# Altium footprint library LUMI_Handy_Soldering_LIB.PcbLib: 562 footprints (part 31 of 36)
Each footprint in its own frame and in the unit in brackets; x right, y up, seen from the top. Pads: shape width x height; smd on the part's side, far side on the other; paste and mask are expansions set on the pad; w line width, h text height; cw(c..) or ccw(c..) is an arc to the next point about the centre after c.
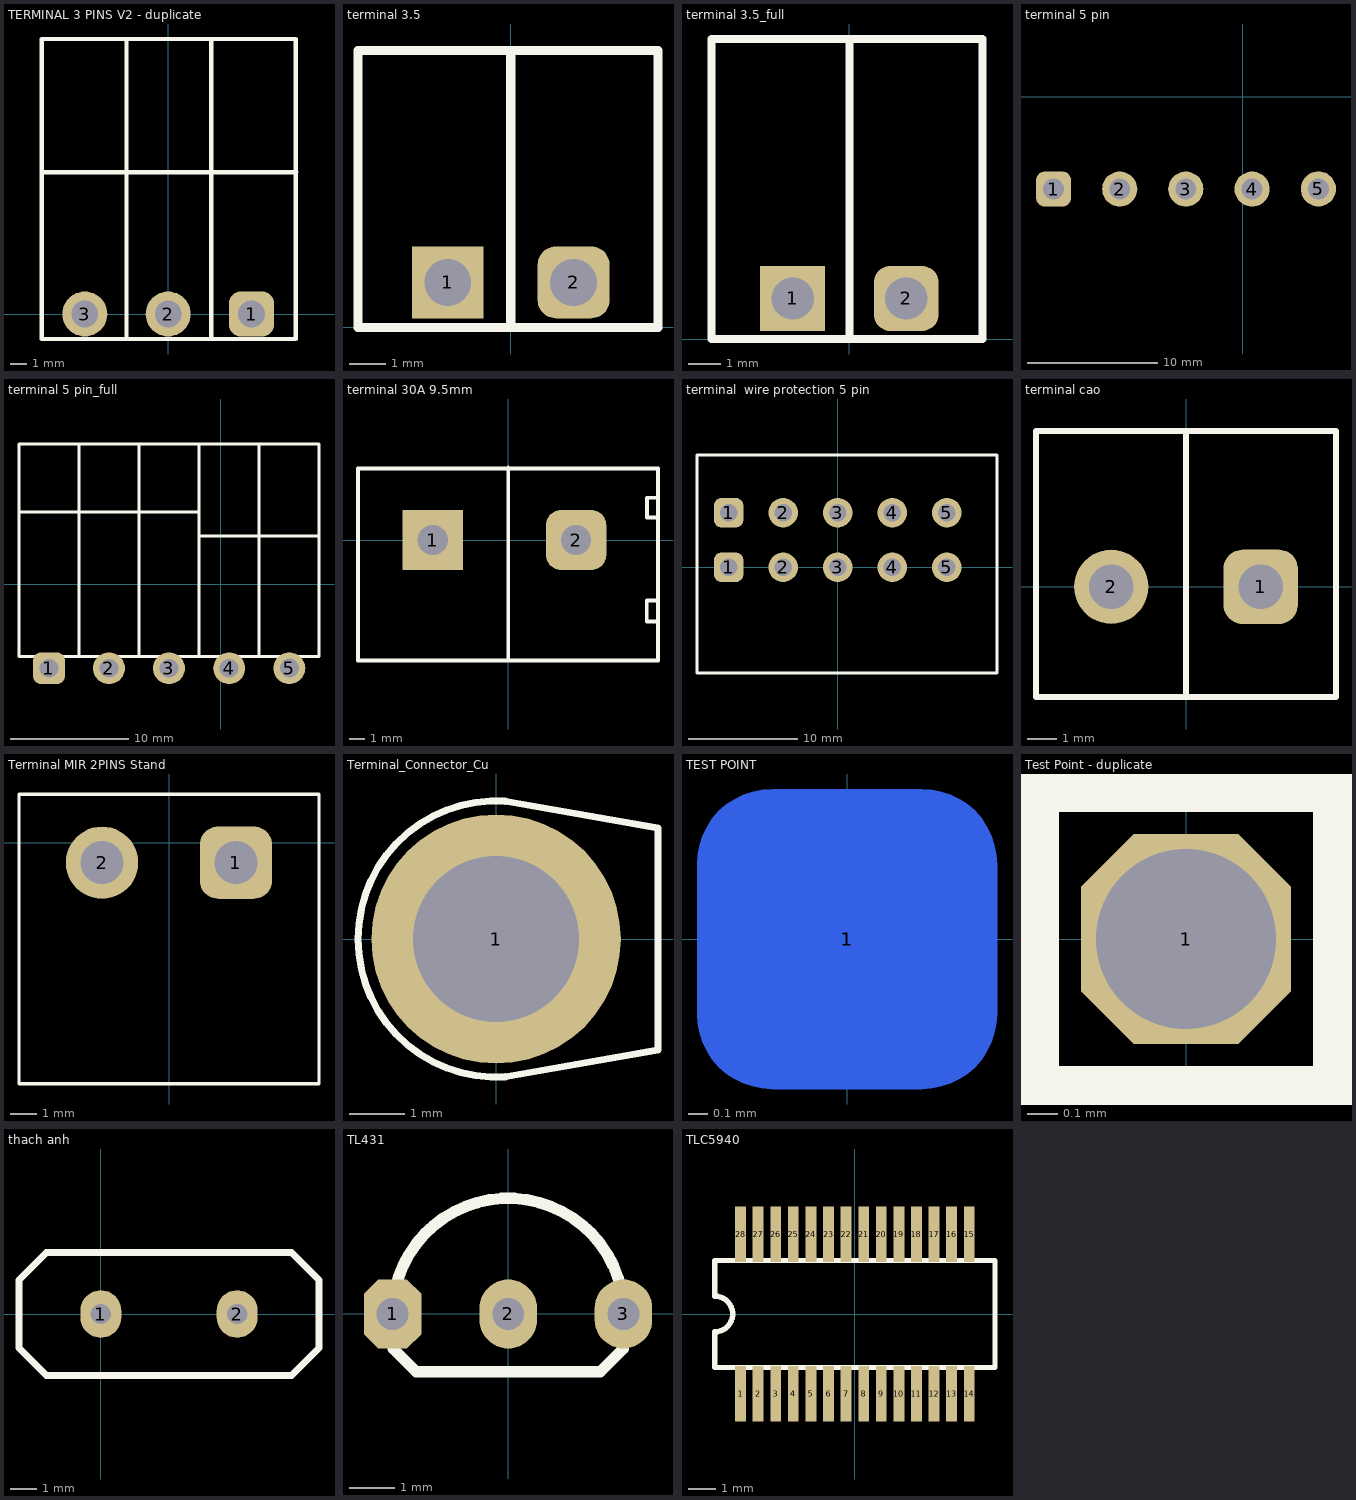
[diagram p30: the footprints below, top view; thin cyan lines are the x and y axes]

## TERMINAL 3 PINS V2 - duplicate [mm]
pads (3):
  rrect50% 2.7x2.7 hole 1.6: 1(5,0)
  round 2.7 hole 1.6: 2(0,0) 3(-5,0)
Top Overlay:
  lines w0.254: -7.56,8.5 2.6,8.5 7.68,8.5 ; -2.5,-1.5 -2.5,16.5 ; 2.58,-1.5 7.66,-1.5 7.66,16.5 2.58,16.5 ; 2.58,-1.5 -7.58,-1.5 -7.58,11.47 -7.58,16.5 2.58,16.5 ; 2.58,-1.5 2.58,16.5
3D body: height 3.5, standoff -11, extent -3.002,-2.989 8.231,17.012
3D body: height 3.5, standoff -11, extent -8.102,-2.989 3.131,17.012

## terminal 3.5 [mm]
pads (2):
  rect 2x2 hole 1.3: 1(-1.75,1.25)
  rrect50% 2x2 hole 1.3: 2(1.75,1.25)
Top Overlay:
  lines w0.254: 0,0 0,7.7 ; -4.25,0 -4.25,7.7 4.1,7.7 4.1,0 -4.25,0
3D body: height 2.5, standoff -8.68, extent -4,2.753 3.798,18.247
3D body: height 6.86, standoff -3.56, extent -4.204,0 4.204,9.144

## terminal 3.5_full [mm]
pads (2):
  rect 2x2 hole 1.3: 1(-1.75,1.25)
  rrect50% 2x2 hole 1.3: 2(1.75,1.25)
Top Overlay:
  lines w0.254: 0,0 0,9.25 ; -4.25,0 4.1,0 4.1,9.25 -4.25,9.25 -4.25,0
3D body: height 6.86, standoff -3.56, extent -4.204,0 4.204,9.144
3D body: height 2.5, standoff -8.68, extent -4,2.753 3.798,18.247

## terminal 5 pin [mm]
pads (5):
  rrect50% 2.7x2.7 hole 1.6: 1(-14.525,-7.108)
  round 2.7 hole 1.6: 2(-9.445,-7.108) 3(-4.365,-7.108) 4(0.733,-7.108) 5(5.827,-7.104)
Top Overlay:
  lines w0.152: -4.365,-7.108 -4.361,-7.112
3D body: height 3.5, standoff -11, extent -2.47,-7.595 8.763,12.407
3D body: height 3.5, standoff -11, extent -17.587,-7.598 -6.354,12.404
3D body: height 3.5, standoff -11, extent -12.507,-7.598 -1.274,12.404

## terminal 5 pin_full [mm]
pads (5):
  rrect50% 2.7x2.7 hole 1.6: 1(-14.525,-7.108)
  round 2.7 hole 1.6: 2(-9.445,-7.108) 3(-4.365,-7.108) 4(0.733,-7.108) 5(5.827,-7.104)
Top Overlay:
  lines w0.152: -4.365,-7.108 -4.361,-7.112
  lines w0.254: -17.065,-6.108 -17.065,11.892 -11.985,11.892 ; -17.065,6.1 -11.985,6.1 -1.825,6.1 ; -16.985,-6.108 -11.905,-6.108 ; -6.905,-6.108 -6.905,11.892 ; -1.822,4.093 8.338,4.093 ; 3.258,-6.115 3.258,11.885 ; -11.985,11.892 -1.825,11.892 -1.825,-6.108 -11.985,-6.108 -11.985,6.862 -11.985,11.892 ; -1.822,-6.115 8.338,-6.115 8.338,11.885 -1.822,11.885 -1.822,6.855 -1.822,-6.115
3D body: height 3.5, standoff -11, extent -2.47,-7.595 8.763,12.407
3D body: height 3.5, standoff -11, extent -17.587,-7.598 -6.354,12.404
3D body: height 3.5, standoff -11, extent -12.507,-7.598 -1.274,12.404

## terminal 30A 9.5mm [mm]
pads (2):
  rect 4x4 hole 2: 1(-5,0)
  rrect50% 4x4 hole 2: 2(4.5,0)
Top Overlay:
  lines w0.254: 0,-7.975 0,4.8 ; 9.9,-5.4 9.175,-5.4 9.175,-4 9.9,-4 ; 9.925,1.5 9.2,1.5 9.2,2.8 9.925,2.8 ; -9.95,-7.975 9.925,-7.975 9.925,4.75 -9.95,4.75 -9.95,-7.975
3D body: height 21.59, standoff -5.51, extent -9.775,-7.829 9.783,4.617

## terminal  wire protection 5 pin [mm]
pads (10):
  rrect50% 2.7x2.7 hole 1.6: 1(-10,0) 1(-10,5)
  round 2.7 hole 1.6: 2(-5,0) 2(-5,5) 3(0,0) 3(0,5) 4(5,0) 4(5,5) 5(10,0) 5(10,5)
Top Overlay:
  lines w0.254: -12.9,-9.7 14.6,-9.7 14.6,10.3 -12.9,10.3 -12.9,-9.7
3D body: height 2.89, standoff -19.45, extent -12.9,-9.675 14.6,10.275

## terminal cao [mm]
pads (2):
  rrect50% 2.524x2.524 hole 1.5: 1(2.54,0)
  round 2.524 hole 1.5: 2(-2.54,0)
Top Overlay:
  lines w0.203: 0,-3.75 0,5.3 ; -5.1,-3.75 5.1,-3.75 5.1,5.3 -5.1,5.3 -5.1,-3.75
3D body: height 3, standoff -14, extent -5.021,-4.428 5.529,4.572

## Terminal KF950 [mm]

## Terminal MIR 2PINS Stand [mm]
pads (2):
  rrect50% 2.7x2.7 hole 1.6: 1(2.5,-0.75)
  round 2.7 hole 1.6: 2(-2.5,-0.75)
Top Overlay:
  lines w0.127: -5.6,-9 -5.6,1.8 5.6,1.8 5.6,-9 -5.6,-9
3D body: height 19, standoff -1, extent -5.602,-9.003 5.631,5.5

## Terminal_Connector_Cu [mm]
pads (1):
  round 4.5 hole 3: 1(0,0)
Top Overlay:
  lines w0.127: 0.169,-2.485 cw(c0,0) 0.169,2.485 2.921,2 2.921,-2 0.169,-2.485
3D body: height 12.13, standoff -2.87, extent -2.5,-2.5 3,2.5

## TEST POINT [mil]
pads (2):
  rrect50% 60x60 smd far side: 1(0,0)
  rrect50% 60x60 on Bottom Solder: 1(0,0)

## Test Point - duplicate [mm]
pads (1):
  oct 0.7x0.7 hole 0.6: 1(0,0)
Top Overlay:
  lines w0.154: -0.5,-0.5 0.5,-0.5 0.5,0.5 -0.5,0.5 -0.5,-0.5

## thach anh [mil]
pads (2):
  oval 60x70 hole 30: 1(0,0) 2(200,0)
Top Overlay:
  lines w10: -120,-50 -120,50 -80,90 280,90 320,50 320,-50 280,-90 -80,-90 -120,-50
3D body: height 137.8, standoff -157.48, extent -123.43,-93.07 323.43,90

## TL431 [mm]
pads (3):
  oct 1.27x1.524 hole 0.7: 1(-2.551,0)
  oval 1.27x1.524 hole 0.7: 2(0,0) 3(2.54,0)
Top Overlay:
  lines w0.254: -2.551,0 cw(c0,0) 2.551,0 ; -2.54,0 -2.54,-0.762 -2.032,-1.27 2.032,-1.27 2.54,-0.762 2.54,0
3D body: height 0.71, standoff -6.99, extent -2.79,-1.6 2.79,2.371

## TLC5940 [mm] "SSOP, Plastic; 28 Leads; Body Width 5.3 mm; Pitch 0.65 mm"
height 1.99
pads (28):
  rect 0.4x2.05 smd: 1(-4.225,-2.943) 2(-3.575,-2.943) 3(-2.925,-2.943) 4(-2.275,-2.943) 5(-1.625,-2.943) 6(-0.975,-2.943) 7(-0.325,-2.943) 8(0.325,-2.943) 9(0.975,-2.943) 10(1.625,-2.943) 11(2.275,-2.943) 12(2.925,-2.943) 13(3.575,-2.943) 14(4.225,-2.943) 15(4.225,2.943) 16(3.575,2.943) 17(2.925,2.943) 18(2.275,2.943) 19(1.625,2.943) 20(0.975,2.943) 21(0.325,2.943) 22(-0.325,2.943) 23(-0.975,2.943) 24(-1.625,2.943) 25(-2.275,2.943) 26(-2.925,2.943) 27(-3.575,2.943) 28(-4.225,2.943)
Top Overlay:
  lines w0.2: -5.175,-1.975 -5.175,-0.658 ccw(c-5.175,0) -5.175,0.658 -5.175,1.975 5.175,1.975 5.175,-1.975 -5.175,-1.975
3D body: height 0.25, standoff 0, extent -3.772,1.499 -3.391,2.896
3D body: height 0.25, standoff 0, extent -4.432,1.499 -4.051,2.896
3D body: height 0.25, standoff 0, extent -3.124,1.499 -2.743,2.896
3D body: height 0.25, standoff 0, extent -2.464,1.499 -2.083,2.896
3D body: height 0.25, standoff 0, extent -1.829,1.499 -1.448,2.896
3D body: height 0.25, standoff 0, extent -1.168,1.499 -0.787,2.896
3D body: height 0.25, standoff 0, extent -0.508,1.499 -0.127,2.896
3D body: height 0.25, standoff 0, extent 0.152,1.499 0.533,2.896
3D body: height 0.25, standoff 0, extent 0.762,1.499 1.143,2.896
3D body: height 0.25, standoff 0, extent 1.422,1.499 1.803,2.896
3D body: height 0.25, standoff 0, extent 2.083,1.499 2.464,2.896
3D body: height 0.25, standoff 0, extent 2.743,1.499 3.124,2.896
3D body: height 0.25, standoff 0, extent 3.378,1.499 3.759,2.896
3D body: height 0.25, standoff 0, extent 4.039,1.499 4.42,2.896
3D body: height 1.02, standoff 0.23, extent -5.143,-1.778 5.144,1.778
3D body: height 0.25, standoff 0, extent 4.039,-3.073 4.42,-1.676
3D body: height 0.25, standoff 0, extent 3.378,-3.073 3.759,-1.676
3D body: height 0.25, standoff 0, extent 2.743,-3.073 3.124,-1.676
3D body: height 0.25, standoff 0, extent 2.083,-3.073 2.464,-1.676
3D body: height 0.25, standoff 0, extent 1.422,-3.073 1.803,-1.676
3D body: height 0.25, standoff 0, extent 0.762,-3.073 1.143,-1.676
3D body: height 0.25, standoff 0, extent 0.152,-3.073 0.533,-1.676
3D body: height 0.25, standoff 0, extent -0.508,-3.073 -0.127,-1.676
3D body: height 0.25, standoff 0, extent -1.168,-3.073 -0.787,-1.676
3D body: height 0.25, standoff 0, extent -1.829,-3.073 -1.448,-1.676
3D body: height 0.25, standoff 0, extent -2.464,-3.073 -2.083,-1.676
3D body: height 0.25, standoff 0, extent -3.124,-3.073 -2.743,-1.676
3D body: height 0.25, standoff 0, extent -4.42,-3.048 -4.039,-1.651
3D body: height 0.25, standoff 0, extent -3.759,-3.048 -3.378,-1.651